# Altium footprint library IMR_Lib - Copy.PcbLib: 50 footprints (part 1 of 4)
Each footprint in its own frame and in the unit in brackets; x right, y up, seen from the top. Pads: shape width x height; smd on the part's side, far side on the other; paste and mask are expansions set on the pad; w line width, h text height; cw(c..) or ccw(c..) is an arc to the next point about the centre after c.
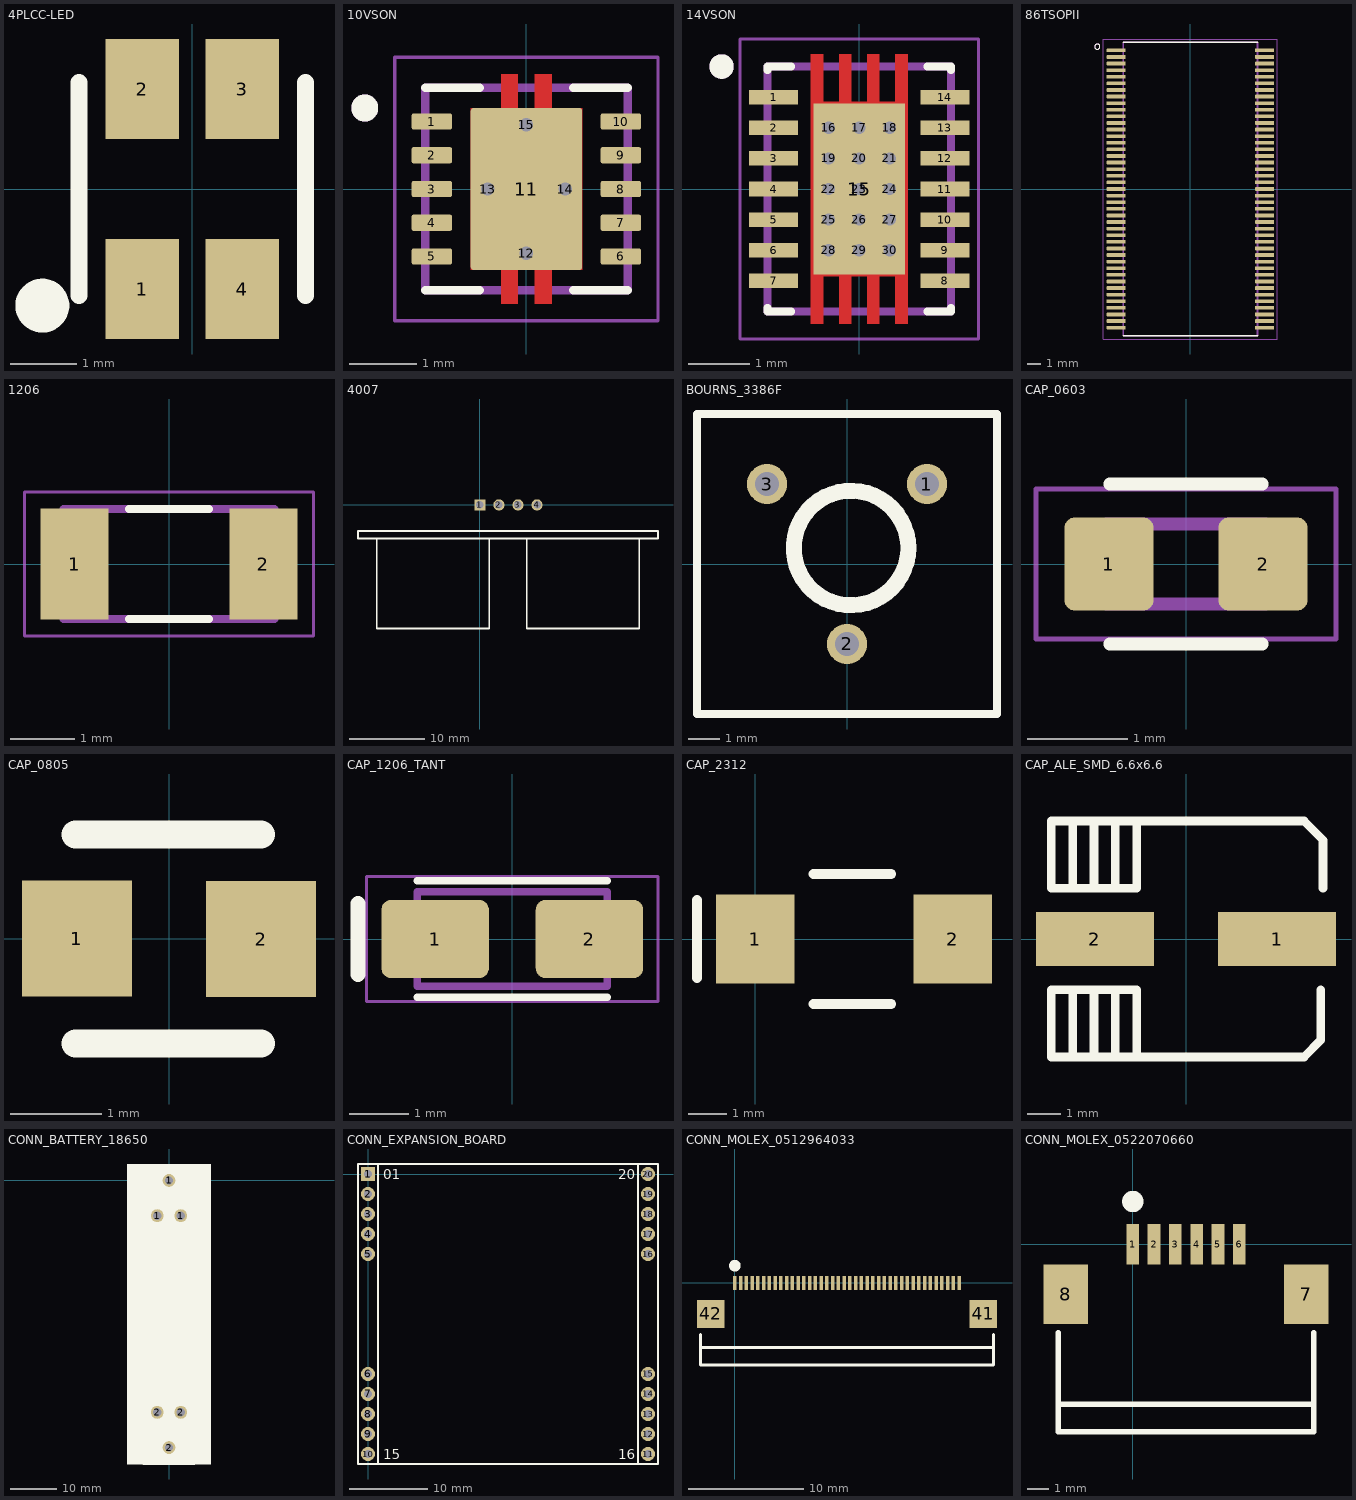
[diagram p0: the footprints below, top view; thin cyan lines are the x and y axes]

## 4PLCC-LED [mm] "HSMF-A201"
height 1.9
pads (4):
  rect 1.1x1.5 smd: 1(-0.75,-1.5) 2(-0.75,1.5) 3(0.75,1.5) 4(0.75,-1.5)
Top Overlay:
  circle w0.508: c-2.25,-1.75 r0.15
  lines w0.254: -1.7,-1.6 -1.7,1.6 ; 1.7,-1.6 1.7,1.6
3D body "4PLCC-LED.step": height 1.1, standoff 0, extent -1.35,-1.6 1.35,1.6

## 10VSON [mm] "IC PACKAGE TPS61230DRCR"
height 1
pads (15):
  rrect25% 0.6x0.24 smd mask+0: 1(-1.4,1) 2(-1.4,0.5) 3(-1.4,0) 4(-1.4,-0.5) 5(-1.4,-1) 6(1.4,-1) 7(1.4,-0.5) 8(1.4,0) 9(1.4,0.5) 10(1.4,1)
  rrect5% 1.65x2.4 smd paste-2 mask+0: 11(0,0)
  round 0.3 hole 0.2 mask+0: 12(0,-0.95) 13(-0.575,0) 14(0.575,0) 15(0,0.95)
Top Layer:
  region: 0.375,1.2 0.825,1.2 0.825,-1.2 0.375,-1.2 0.375,-1.7 0.125,-1.7 0.125,-1.2 -0.125,-1.2 -0.125,-1.7 -0.375,-1.7 -0.375,-1.2 -0.825,-1.2 -0.825,1.2 -0.375,1.2 -0.375,1.7 -0.125,1.7 -0.125,1.2 0.125,1.2 0.125,1.7 0.375,1.7
Top Overlay:
  circle w0.2: c-2.395,1.2 r0.1
  lines w0.127: -1.5,-1.5 -0.695,-1.5 ; -1.5,1.5 -0.695,1.5 ; 0.695,-1.5 1.5,-1.5 ; 0.695,1.5 1.5,1.5
Top Paste:
  region: -0.125,-1.7 -0.375,-1.7 -0.375,-1.36 -0.125,-1.36
  region: 0.375,-1.7 0.125,-1.7 0.125,-1.36 0.375,-1.36
  region: 0.75,-1.16 -0.75,-1.16 -0.75,-0.1 0.75,-0.1
  region: 0.75,0.1 -0.75,0.1 -0.75,1.16 0.75,1.16
  region: 0.375,1.36 0.125,1.36 0.125,1.7 0.375,1.7
  region: -0.125,1.36 -0.375,1.36 -0.375,1.7 -0.125,1.7
Top Solder:
  region: -1.03,-1.19 -1.77,-1.19 -1.77,-0.81 -1.03,-0.81
  region: -1.03,-0.69 -1.77,-0.69 -1.77,-0.31 -1.03,-0.31
  region: 0.445,1.27 0.895,1.27 0.895,-1.27 0.445,-1.27 0.445,-1.77 0.055,-1.77 0.055,-1.27 -0.055,-1.27 -0.055,-1.77 -0.445,-1.77 -0.445,-1.27 -0.895,-1.27 -0.895,1.27 -0.445,1.27 -0.445,1.77 -0.055,1.77 -0.055,1.27 0.055,1.27 0.055,1.77 0.445,1.77
  region: -1.03,0.81 -1.77,0.81 -1.77,1.19 -1.03,1.19
  region: -1.03,-0.19 -1.77,-0.19 -1.77,0.19 -1.03,0.19
  region: -1.03,0.31 -1.77,0.31 -1.77,0.69 -1.03,0.69
  region: 1.77,-1.19 1.03,-1.19 1.03,-0.81 1.77,-0.81
  region: 1.77,-0.69 1.03,-0.69 1.03,-0.31 1.77,-0.31
  region: 1.77,-0.19 1.03,-0.19 1.03,0.19 1.77,0.19
  region: 1.77,0.31 1.03,0.31 1.03,0.69 1.77,0.69
  region: 1.77,0.81 1.03,0.81 1.03,1.19 1.77,1.19
Mechanical 13:
  circle w0.2: c-2.395,1.2 r0.1
  lines w0.127: -1.5,-1.5 -1.5,1.5 1.5,1.5 1.5,-1.5 -1.5,-1.5
Mechanical 15:
  lines w0.05: -1.95,-1.95 -1.95,1.95 1.95,1.95 1.95,-1.95 -1.95,-1.95
3D body "10VSON.STEP": height 1, standoff 0, extent -1.5,-1.5 1.5,1.5

## 14VSON [mm] "IC PACKAGE TPS63020DSJR"
height 1
pads (30):
  rect 0.8x0.24 smd: 1(-1.4,1.5) 2(-1.4,1) 3(-1.4,0.5) 4(-1.4,0) 5(-1.4,-0.5) 6(-1.4,-1) 7(-1.4,-1.5) 8(1.4,-1.5) 9(1.4,-1) 10(1.4,-0.5) 11(1.4,0) 12(1.4,0.5) 13(1.4,1) 14(1.4,1.5)
  rect 1.5x2.8 smd paste-2 mask+0: 15(0,0)
  round 0.3 hole 0.2: 16(-0.5,1) 17(0,1) 18(0.5,1) 19(-0.5,0.5) 20(0,0.5) 21(0.5,0.5) 22(-0.5,0) 23(0,0) 24(0.5,0) 25(-0.5,-0.5) 26(0,-0.5) 27(0.5,-0.5) 28(-0.5,-1) 29(0,-1) 30(0.5,-1)
Top Layer:
  region: 0.79,-2.2 0.59,-2.2 0.59,-1.425 0.33,-1.425 0.33,-2.2 0.13,-2.2 0.13,-1.425 -0.13,-1.425 -0.13,-2.2 -0.33,-2.2 -0.33,-1.425 -0.59,-1.425 -0.59,-2.2 -0.79,-2.2 -0.79,2.2 -0.59,2.2 -0.59,1.425 -0.33,1.425 -0.33,2.2 -0.13,2.2 -0.13,1.425 0.13,1.425 0.13,2.2 0.33,2.2 0.33,1.425 0.59,1.425 0.59,2.2 0.79,2.2
Top Overlay:
  circle w0.2: c-2.25,2 r0.1
  lines w0.127: -1.5,-1.94 -1.5,-2 -1.11,-2 ; -1.5,1.94 -1.5,2 -1.11,2 ; 1.11,-2 1.5,-2 1.5,-1.94 ; 1.11,2 1.5,2 1.5,1.94
Top Paste:
  region: 0.79,0.1 0.13,0.1 0.13,2.2 0.33,2.2 0.33,1.35 0.59,1.35 0.59,2.2 0.79,2.2
  region: 0.79,-2.2 0.59,-2.2 0.59,-1.35 0.33,-1.35 0.33,-2.2 0.13,-2.2 0.13,-0.1 0.79,-0.1
  region: -0.13,0.1 -0.79,0.1 -0.79,2.2 -0.59,2.2 -0.59,1.35 -0.33,1.35 -0.33,2.2 -0.13,2.2
  region: -0.13,-2.2 -0.33,-2.2 -0.33,-1.35 -0.59,-1.35 -0.59,-2.2 -0.79,-2.2 -0.79,-0.1 -0.13,-0.1
Top Solder:
  drawing of 14 lines, arcs and shapes, not listed
Mechanical 13:
  circle w0.2: c-2.25,2 r0.1
  lines w0.127: -1.5,-2 1.5,-2 1.5,2 -1.5,2 -1.5,-2
Mechanical 15:
  lines w0.05: -1.95,-2.45 1.95,-2.45 1.95,2.45 -1.95,2.45 -1.95,-2.45
3D body "14VSON.step": height 1.05, standoff 0, extent -1.6,-2.054 1.574,2.1

## 86TSOPII [mm] "SOP50P1176X120-86N"
height 1
pads (86):
  rrect25% 1.44x0.28 smd: 1(-5.62,10.5) 2(-5.62,10) 3(-5.62,9.5) 4(-5.62,9) 5(-5.62,8.5) 6(-5.62,8) 7(-5.62,7.5) 8(-5.62,7) 9(-5.62,6.5) 10(-5.62,6) 11(-5.62,5.5) 12(-5.62,5) 13(-5.62,4.5) 14(-5.62,4) 15(-5.62,3.5) 16(-5.62,3) 17(-5.62,2.5) 18(-5.62,2) 19(-5.62,1.5) 20(-5.62,1) 21(-5.62,0.5) 22(-5.62,0) 23(-5.62,-0.5) 24(-5.62,-1) 25(-5.62,-1.5) 26(-5.62,-2) 27(-5.62,-2.5) 28(-5.62,-3) 29(-5.62,-3.5) 30(-5.62,-4) 31(-5.62,-4.5) 32(-5.62,-5) 33(-5.62,-5.5) 34(-5.62,-6) 35(-5.62,-6.5) 36(-5.62,-7) 37(-5.62,-7.5) 38(-5.62,-8) 39(-5.62,-8.5) 40(-5.62,-9) 41(-5.62,-9.5) 42(-5.62,-10) 43(-5.62,-10.5) 44(5.62,-10.5) 45(5.62,-10) 46(5.62,-9.5) 47(5.62,-9) 48(5.62,-8.5) 49(5.62,-8) 50(5.62,-7.5) 51(5.62,-7) 52(5.62,-6.5) 53(5.62,-6) 54(5.62,-5.5) 55(5.62,-5) 56(5.62,-4.5) 57(5.62,-4) 58(5.62,-3.5) 59(5.62,-3) 60(5.62,-2.5) 61(5.62,-2) 62(5.62,-1.5) 63(5.62,-1) 64(5.62,-0.5) 65(5.62,0) 66(5.62,0.5) 67(5.62,1) 68(5.62,1.5) 69(5.62,2) 70(5.62,2.5) 71(5.62,3) 72(5.62,3.5) 73(5.62,4) 74(5.62,4.5) 75(5.62,5) 76(5.62,5.5) 77(5.62,6) 78(5.62,6.5) 79(5.62,7) 80(5.62,7.5) 81(5.62,8) 82(5.62,8.5) 83(5.62,9) 84(5.62,9.5) 85(5.62,10) 86(5.62,10.5)
Top Overlay:
  circle w0: c-7.06,10.78 r0.2
  lines w0.127: -5.08,-11.11 5.08,-11.11 ; -5.08,11.11 5.08,11.11
Mechanical 13:
  circle w0: c-7.06,10.78 r0.2
  lines w0.127: -5.08,-11.11 5.08,-11.11 5.08,11.11 -5.08,11.11 -5.08,-11.11
Mechanical 15:
  lines w0.05: -6.59,-11.36 -6.59,11.36 6.59,11.36 6.59,-11.36 -6.59,-11.36
3D body "86TSOPII.step": height 1.25, standoff 0, extent -5.896,-11.11 5.896,11.11

## 1206 [mm] "1206 PACKAGE"
height 1
pads (2):
  rect 1.05x1.72 smd: 1(-1.46,0) 2(1.46,0)
Top Overlay:
  lines w0.127: -0.62,-0.85 0.62,-0.85 ; -0.62,0.85 0.62,0.85
Mechanical 13:
  lines w0.127: -1.63,-0.85 1.63,-0.85 1.63,0.85 -1.63,0.85 -1.63,-0.85
Mechanical 15:
  lines w0.05: -2.235,-1.112 -2.235,1.112 2.235,1.112 2.235,-1.112 -2.235,-1.112
3D body "1206.step": height 0.6, standoff 0, extent -1.6,-0.8 1.6,0.8

## 4007 [mm] "HC-S04 ULTRA SONIC SENSOR"
height 18
pads (4):
  rect 1.5x1.5 hole 1: 1(0,0)
  round 1.5 hole 1: 2(2.54,0) 3(5.08,0) 4(7.62,0)
Top Overlay:
  lines w0.254: -13.75,-4.5 -13.75,-16.5 1.25,-16.5 1.25,-4.5 ; 6.25,-4.5 6.25,-16.5 21.25,-16.5 21.25,-4.5 ; -16.25,-4.5 -16.25,-3.5 23.75,-3.5 23.75,-4.5 -16.25,-4.5
3D body "4007.STEP": height 21.5, standoff -3.68, extent -19,-17.668 26,0.4

## BOURNS_3386F [mil] "RESISTOR POT 3386F SERIES"
height 410
pads (3):
  round 50 hole 30: 1(100,100) 2(0,-100) 3(-100,100)
Top Overlay:
  circle w20: c5,20 r71.59
  lines w10: -187.5,-187.5 -187.5,187.5 187.5,187.5 187.5,-187.5 -187.5,-187.5
3D body "BOURNS_3386F.STEP": height 411.85, standoff -233.15, extent -188.5,-190.15 188.5,196.85

## CAP_0603 [mm] "CAP 0603 50V"
height 0.9
pads (2):
  rrect22% 0.89x0.93 smd: 1(-0.77,0) 2(0.77,0)
Top Overlay:
  lines w0.127: -0.762,-0.8 0.762,-0.8 ; -0.762,0.8 0.762,0.8
Mechanical 13:
  circle w0.1: c-1.05,0 r0.05
  lines w0.127: -0.8,-0.4 0.8,-0.4 0.8,0.4 -0.8,0.4 -0.8,-0.4
Mechanical 15:
  lines w0.05: -1.5,-0.75 -1.5,0.75 1.5,0.75 1.5,-0.75 -1.5,-0.75
3D body "CAP_0603.STEP": height 0.8, standoff 0, extent -0.8,-0.4 0.8,0.4

## CAP_0805 [mm]
height 1
pads (2):
  rect 1.2x1.27 smd: 1(-1.008,0.003) 2(1.008,-0.003)
Top Overlay:
  lines w0.305: -1.024,-1.146 1.008,-1.146 ; -1.024,1.14 1.008,1.14
3D body "CAP_0805.stp": height 0.92, standoff 0.04, extent -1.2,-0.7 1,0.75

## CAP_1206_TANT [mm] "CAP 1206 POLARIZED"
height 1.8
pads (2):
  rrect25% 1.81x1.32 smd: 1(-1.3,0) 2(1.3,0)
Top Overlay:
  lines w0.127: -1.6,-0.98 1.6,-0.98 ; -1.6,0.98 1.6,0.98
  lines w0.254: -2.6,-0.6 -2.6,0.6
Mechanical 13:
  lines w0.127: -1.6,-0.8 1.6,-0.8 1.6,0.8 -1.6,0.8 -1.6,-0.8
Mechanical 15:
  lines w0.05: -2.455,-1.05 -2.455,1.05 2.455,1.05 2.455,-1.05 -2.455,-1.05
3D body "CAP_TANT_C3216_1206.step": height 1.8, standoff 0, extent -1.7,-0.9 1.7,0.9

## CAP_2312 [mm] "Cap Tantalum 2312 (6032 metric)"
height 2.8
pads (2):
  rect 2.03x2.28 smd: 1(0,0) 2(5.08,0)
Top Overlay:
  lines w0.254: -1.5,-1 -1.5,1 ; 1.5,-1.675 3.5,-1.675 ; 1.5,1.675 3.5,1.675
3D body "CAP_2312.step": height 2.7, standoff 0, extent -0.55,-1.675 5.55,1.675

## CAP_ALE_SMD_6.6x6.6 [mm] "CAP_ALE BODY SIZE 6.6mm x 6.6mm 3.9mm Tall"
height 4
pads (2):
  rect 3.5x1.6 smd: 1(2.7,0) 2(-2.7,0)
Top Overlay:
  lines w0.254: -4,-2.04 -4,-1.913 ; -4,1.913 -4,2.04 ; -3.365,-3.5 -3.365,-1.5 ; -3.365,1.5 -3.365,3.5 ; -2.73,-3.5 -2.73,-1.5 ; -2.73,1.5 -2.73,3.5 ; -2.095,-3.5 -2.095,-1.5 ; -2.095,1.5 -2.095,3.5 ; -1.46,-3.5 -1.46,-1.5 -4,-1.5 -4,-3.5 3.5,-3.5 4,-3 4,-1.5 ; -1.46,3.5 -1.46,1.5 -4,1.5 -4,3.5 3.5,3.5 4.065,2.935 4.065,1.5
3D body "CAP_ALE_SMD_6.6x6.6.STEP": height 3.91, standoff 0, extent -3.414,-3.3 3.586,3.3

## CONN_BATTERY_18650 [mil] "BATTERY CONNECTOR 18650 MADE OF 2X KEYSTONE 54"
height 629.92
pads (6):
  round 110 hole 70: 1(-100,-300) 1(0,0) 1(100,-300) 2(-100,-1974.88) 2(0,-2274.88) 2(100,-1974.88)
Top Overlay:
  pour cut-out: -354.33,140 354.33,140 354.33,-2414.88 -354.33,-2414.88
  lines w10: -50,-1857.91 50,-1857.91 ; -50,-457.91 50,-457.91 ; 0,-507.91 0,-407.91 ; -220,-2414.88 220,-2414.88 220,-1904.88 -220,-1904.88 -220,-2414.88 ; -220,-370 220,-370 220,140 -220,140 -220,-370
Mechanical 15:
  lines w10: -220,-2414.88 220,-2414.88 220,140 -220,140 -220,-2414.88
3D body "KEYSTONE_54.step": height 724.41, standoff -116.25, extent -356.33,-370.08 356.33,142.01
3D body "KEYSTONE_54.step": height 724.41, standoff -116.25, extent -360.27,-2417.32 352.39,-1905.24
3D body: height 728.04, standoff 59.36, extent -334.65,-2322.84 334.65,59.06

## CONN_EXPANSION_BOARD [mil] "EXPANSION BOARD CONNECTOR 30 PIN 100 MIL SPACING"
height 334.65
pads (20):
  rect 70x70 hole 40: 1(0,0)
  round 70 hole 40: 2(0,-100) 3(0,-200) 4(0,-300) 5(0,-400) 6(0,-1000) 7(0,-1100) 8(0,-1200) 9(0,-1300) 10(0,-1400) 11(1400,-1400) 12(1400,-1300) 13(1400,-1200) 14(1400,-1100) 15(1400,-1000) 16(1400,-400) 17(1400,-300) 18(1400,-200) 19(1400,-100) 20(1400,0)
Top Overlay:
  lines w10: 50,-1450 -50,-1450 -50,50 50,50 ; 50,-1450 1450,-1450 ; 50,-1450 50,50 ; 50,50 1450,50 ; 1450,-1450 1350,-1450 1350,50 1400,50 1450,50 ; 1450,-1450 1450,50
  text "15" at 75,-1425 h50
  text "16" at 1250,-1425 h50
  text "01" at 75,-25 h50
  text "20" at 1250,-25 h50
3D body "CONN_HDR_SOCKET_1X5_100MIL.step": height 237.01, standoff -122.05, extent -48.82,-1450 51.18,-950
3D body "CONN_HDR_SOCKET_1X5_100MIL.step": height 237.01, standoff -122.05, extent 1351.18,-1450 1451.18,-950
3D body "CONN_HDR_SOCKET_1X5_100MIL.step": height 237.01, standoff -122.05, extent 1351.18,-450 1451.18,50
3D body "CONN_HDR_SOCKET_1X5_100MIL.step": height 237.01, standoff -122.05, extent -48.82,-454.72 51.18,45.28

## CONN_MOLEX_0512964033 [mm] "MOLEX 0512964033 RGB888 NEW HAVEN CONNECTOR"
height 2
pads (42):
  rect 0.3x1.2 smd: 1(0,0) 2(0.5,0) 3(1,0) 4(1.5,0) 5(2,0) 6(2.5,0) 7(3,0) 8(3.5,0) 9(4,0) 10(4.5,0) 11(5,0) 12(5.5,0) 13(6,0) 14(6.5,0) 15(7,0) 16(7.5,0) 17(8,0) 18(8.5,0) 19(9,0) 20(9.5,0) 21(10,0) 22(10.5,0) 23(11,0) 24(11.5,0) 25(12,0) 26(12.5,0) 27(13,0) 28(13.5,0) 29(14,0) 30(14.5,0) 31(15,0) 32(15.5,0) 33(16,0) 34(16.5,0) 35(17,0) 36(17.5,0) 37(18,0) 38(18.5,0) 39(19,0) 40(19.5,0)
  rect 2.4x2.4 smd: 41(21.6,-2.7) 42(-2.1,-2.7)
Top Overlay:
  circle w0.508: c0,1.5 r0.25
  lines w0.254: -3,-5.6 22.5,-5.6 ; -3,-4.5 -3,-7.15 22.5,-7.15 22.5,-4.5
3D body "CONN_MOLEX_512964033.stp": height 1.35, standoff 0.05, extent -2.1,-4.3 21.6,0

## CONN_MOLEX_0522070660 [mm] "MOLEX 0522070660 NEW HAVEN TOUCH"
height 3
pads (8):
  rect 0.6x1.9 smd: 1(0,0) 2(1,0) 3(2,0) 4(3,0) 5(4,0) 6(5,0)
  rect 2.1x2.8 smd: 7(8.15,-2.35) 8(-3.15,-2.35)
Top Overlay:
  circle w0.508: c0,2 r0.25
  lines w0.254: -3.5,-7.525 8.5,-7.525 ; -3.5,-4.175 -3.5,-8.825 8.5,-8.825 8.5,-4.175
3D body "CONN_MOLEX_522070660.stp": height 2.75, standoff 0.05, extent -3.65,-7.55 8.65,0.05